# Altium footprint library 7.Connectors&Battary_holders.PcbLib: 133 footprints (part 7 of 9)
Each footprint in its own frame and in the unit in brackets; x right, y up, seen from the top. Pads: shape width x height; smd on the part's side, far side on the other; paste and mask are expansions set on the pad; w line width, h text height; cw(c..) or ccw(c..) is an arc to the next point about the centre after c.
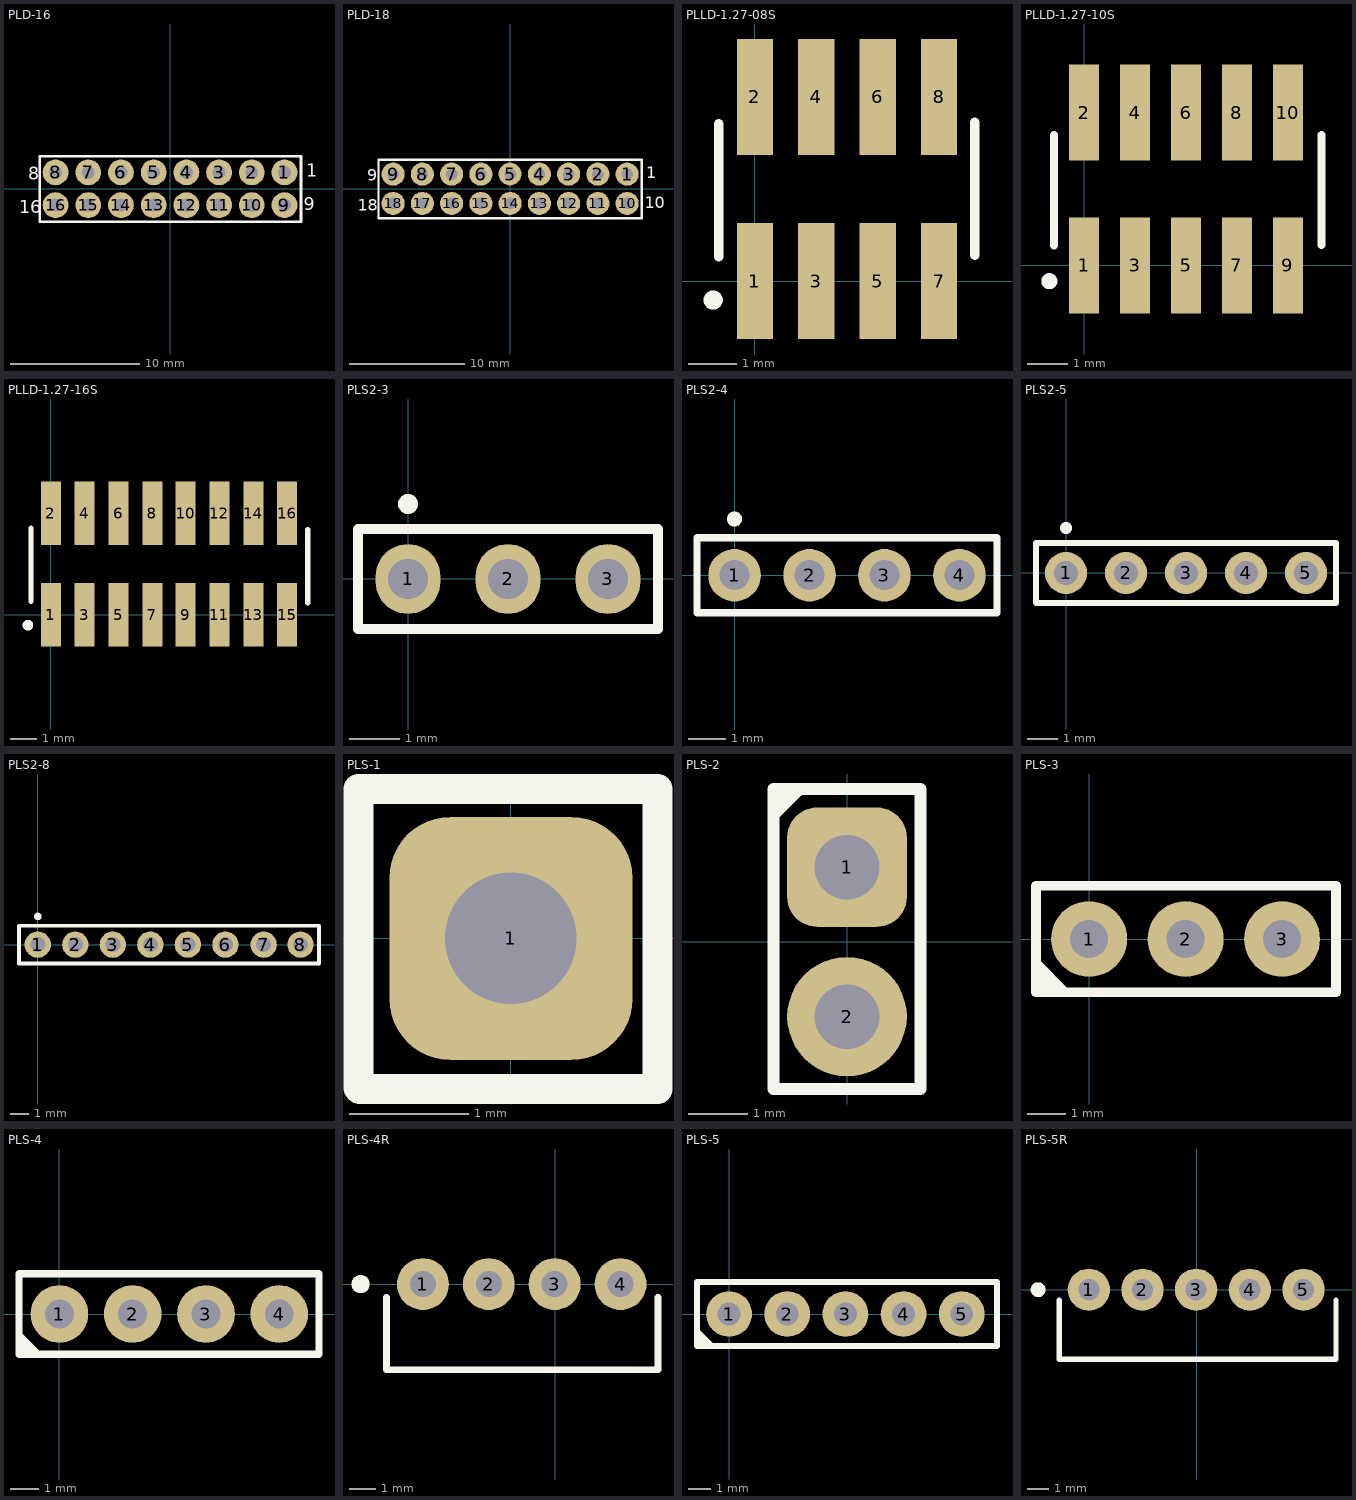
[diagram p6: the footprints below, top view; thin cyan lines are the x and y axes]

## PLD-16 [mm]
pads (16):
  round 2 hole 1: 1(8.87,1.265) 2(6.33,1.265) 3(3.79,1.265) 4(1.25,1.265) 5(-1.29,1.265) 6(-3.83,1.265) 7(-6.37,1.265) 8(-8.91,1.265) 9(8.87,-1.275) 10(6.33,-1.275) 11(3.79,-1.275) 12(1.25,-1.275) 13(-1.29,-1.275) 14(-3.83,-1.275) 15(-6.37,-1.275) 16(-8.91,-1.275)
Top Overlay:
  lines w0.2: -10.15,-2.575 10.15,-2.575 10.15,2.525 -10.15,2.525 -10.15,-2.575
  text "1" at 10.55,0.925 h1
  text "8" at -11.05,0.7 h1
  text "16" at -11.75,-1.9 h1
  text "9" at 10.35,-1.675 h1
3D body "User Library-PLD-16.step": height 8.6, standoff -3, extent -10.129,-2.48 10.191,2.52

## PLD-18 [mm]
pads (18):
  round 2 hole 1: 1(10.17,1.265) 2(7.63,1.265) 3(5.09,1.265) 4(2.55,1.265) 5(0,1.275) 6(-2.53,1.265) 7(-5.07,1.265) 8(-7.61,1.265) 9(-10.15,1.265) 10(10.17,-1.275) 11(7.63,-1.275) 12(5.09,-1.275) 13(2.55,-1.275) 14(0.01,-1.275) 15(-2.53,-1.275) 16(-5.07,-1.275) 17(-7.61,-1.275) 18(-10.15,-1.275)
Top Overlay:
  lines w0.2: -11.425,-2.575 11.45,-2.575 11.45,2.525 -11.425,2.525 -11.425,-2.575
  text "10" at 11.7,-1.675 h1
  text "18" at -13.2,-1.9 h1
  text "9" at -12.4,0.7 h1
  text "1" at 11.85,0.925 h1
3D body "PLD-18.step": height 7.93, standoff -3.45, extent -11.41,-2.54 11.45,2.54

## PLLD-1.27-08S [mm]
pads (8):
  rect 0.75x2.4 smd: 1(0,0) 2(0,3.81) 3(1.27,0) 4(1.27,3.81) 5(2.54,0) 6(2.54,3.81) 7(3.81,0) 8(3.81,3.81)
Top Overlay:
  circle w0.2: c-0.867,-0.394 r0.1
  lines w0.2: -0.75,0.5 -0.75,3.25 ; 4.552,0.539 4.552,3.289
3D body "User Library-KLS1-207C-2-08-T.step": height 4.46, standoff 0, extent -0.618,-0.795 4.462,4.605

## PLLD-1.27-10S [mm]
pads (10):
  rect 0.75x2.4 smd: 1(0,0) 2(0,3.81) 3(1.27,0) 4(1.27,3.81) 5(2.54,0) 6(2.54,3.81) 7(3.81,0) 8(3.81,3.81) 9(5.08,0) 10(5.08,3.81)
Top Overlay:
  circle w0.2: c-0.867,-0.394 r0.1
  lines w0.2: -0.75,0.5 -0.75,3.25 ; 5.92,0.507 5.92,3.257
3D body "User Library-KLS1-207C-2-10-T.step": height 4.46, standoff 0, extent -0.606,-0.727 5.744,4.673

## PLLD-1.27-16S [mm]
pads (16):
  rect 0.75x2.4 smd: 1(0,0) 2(0,3.81) 3(1.27,0) 4(1.27,3.81) 5(2.54,0) 6(2.54,3.81) 7(3.81,0) 8(3.81,3.81) 9(5.065,0) 10(5.065,3.81) 11(6.335,0) 12(6.335,3.81) 13(7.605,0) 14(7.605,3.81) 15(8.875,0) 16(8.875,3.81)
Top Overlay:
  circle w0.2: c-0.867,-0.394 r0.1
  lines w0.2: -0.75,0.5 -0.75,3.25 ; 9.657,0.445 9.657,3.195
3D body "User Library-KLS1-207C-2-08-T.step": height 4.46, standoff 0, extent 4.447,-0.795 9.527,4.605
3D body "User Library-KLS1-207C-2-08-T.step": height 4.46, standoff 0, extent -0.618,-0.795 4.462,4.605

## PLS2-3 [mm]
pads (3):
  oval 1.3x1.4 hole 0.8: 1(0,0) 2(2,0) 3(4,0)
Top Overlay:
  circle w0.2: c0,1.5 r0.1
  lines w0.2: -1,-1 -1,1 5,1 5,-1 -1,-1
3D body "User Library-pls2-3.STEP": height 6.1, standoff -2.7, extent -1,-1 5,1
3D body "25974.stp": height 6, standoff 2.55, extent 1.15,-0.925 5,1

## PLS2-4 [mm]
pads (4):
  round 1.4 hole 0.8: 1(0,0) 2(2,0) 3(4,0) 4(6,0)
Top Overlay:
  circle w0.2: c0,1.5 r0.1
  lines w0.2: -1,-1 7,-1 7,1 -1,1 -1,-1
3D body "User Library-pls2-4_asm.STEP": height 6.1, standoff -2.7, extent -1,-1 7,1

## PLS2-5 [mm]
pads (5):
  round 1.4 hole 0.8: 1(0,0) 2(2,0) 3(4,0) 4(6,0) 5(8,0)
Top Overlay:
  circle w0.2: c0,1.5 r0.1
  lines w0.2: -1,-1 -1,1 9,1 9,-1 -1,-1
3D body "User Library-pls2-4_asm.STEP": height 6.1, standoff -2.7, extent -1,-1 7,1
3D body "User Library-pls2-4_asm.STEP": height 6.1, standoff -2.7, extent 1,-1 9,1

## PLS2-8 [mm]
pads (8):
  round 1.4 hole 0.8: 1(0,0) 2(2,0) 3(4,0) 4(6,0) 5(8,0) 6(10,0) 7(12.04,0) 8(14,0)
Top Overlay:
  circle w0.2: c0,1.5 r0.1
  lines w0.2: -1,-1 14.989,-1 14.989,1 -1,1 -1,-1
3D body "User Library-pls2-4_asm.STEP": height 6.1, standoff -2.7, extent 6.976,-1.061 14.976,0.939
3D body "User Library-pls2-4_asm.STEP": height 6.1, standoff -2.7, extent -1,-1 7,1

## PLS-1 [mil]
pads (1):
  rrect50% 80x80 hole 43.31: 1(0,0)
Top Overlay:
  lines w10: -50.18,-49.21 -49.83,-49.57 48.23,-49.57 48.23,49.21 -50.18,49.21 -50.18,-49.21
3D body "User Library-PLS1.step": height 340.16, standoff -114.17, extent -50,-50 50,50

## PLS-2 [mil] "PLS-2 вилка штыревая 2.54мм 1x2 прямая"
height 456.69
pads (2):
  rrect50% 80x80 hole 43.31: 1(0,50)
  round 80 hole 43.31: 2(0,-50)
Top Overlay:
  lines w7.87: -49.21,78.74 -49.21,102.36 -15.75,102.36 49.21,102.36 49.21,19.68 49.21,-98.43 -49.21,-98.43 -49.21,-19.68 -49.21,84.65 -32.48,101.38 ; -49.21,88.58 -39.37,98.43
3D body "PLS-2.step": height 335.43, standoff -97.64, extent -49.21,-100 49.21,100

## PLS-3 [mm]
pads (3):
  round 2 hole 1: 1(0,0) 2(2.54,0) 3(5.08,0)
Top Overlay:
  lines w0.2: -1.3,-1 -1.1,-1.2 -1.1,-1.4 -1.4,-1.1 -1.4,-0.8 -0.8,-1.4 -0.6,-1.4 -1.4,-0.6 ; -1.4,-0.6 -1.4,-0.6
  lines w0.254: -1.4,-1.4 -1.4,1.4 6.5,1.4 6.5,-1.4 -1.4,-1.4
3D body "User Library-PLS-03.step": height 8, standoff -3.3, extent -1.21,-1.2 6.41,1.3

## PLS-4 [mm]
pads (4):
  round 2 hole 1: 1(0,0) 2(2.54,0) 3(5.08,0) 4(7.62,0)
Top Overlay:
  lines w0.2: -1.4,-0.7 -0.7,-1.4 -0.9,-1.4 -1.3,-1 -1.3,-1.3 -1.2,-1.2 -1.1,-1.2
  lines w0.254: -1.4,-1.4 9,-1.4 9,1.4 -1.4,1.4 -1.4,-1.4
3D body "User Library-PLS-03.step": height 8, standoff -3.3, extent -1.27,-1.281 6.35,1.219
3D body "User Library-PLS-03.step": height 8, standoff -3.3, extent 1.262,-1.281 8.882,1.219

## PLS-4R [mm]
pads (4):
  round 2 hole 1: 1(-5.1,0) 2(-2.56,0) 3(-0.02,0) 4(2.52,0)
Top Overlay:
  circle w0.5: c-7.5,0 r0.1
  lines w0.254: -6.5,-0.5 -6.5,-3.3 3.961,-3.3 3.961,-0.5
3D body "User Library-PLS-4R.step": height 5.45, standoff -3, extent -6.363,-7.338 3.797,1.282

## PLS-5 [mm]
pads (5):
  round 2 hole 1: 1(0,0) 2(2.54,0) 3(5.08,0) 4(7.62,0) 5(10.16,0)
Top Overlay:
  lines w0.2: -1.4,-0.7 -0.7,-1.4 -0.9,-1.4 -1.3,-1 -1.3,-1.3 -1.2,-1.2 -1.1,-1.2
  lines w0.254: -1.4,-1.4 -1.4,1.4 11.7,1.4 11.7,-1.4 -1.4,-1.4
3D body "User Library-PLS-5.step": height 8.54, standoff -3, extent -1.2,-1.3 11.5,1.24

## PLS-5R [mm]
pads (5):
  round 2 hole 1: 1(-5.1,0) 2(-2.56,0) 3(-0.02,0) 4(2.52,0) 5(5.06,0)
Top Overlay:
  circle w0.5: c-7.5,0 r0.1
  lines w0.254: -6.5,-0.5 -6.5,-3.3 6.6,-3.3 6.6,-0.5
3D body "User Library-PLS-5R.step": height 2.54, standoff -2.54, extent -6.25,-9.249 6.45,0.2